# Altium footprint library MiscDevices.PcbLib: 251 footprints (part 5 of 16)
Each footprint in its own frame and in the unit in brackets; x right, y up, seen from the top. Pads: shape width x height; smd on the part's side, far side on the other; paste and mask are expansions set on the pad; w line width, h text height; cw(c..) or ccw(c..) is an arc to the next point about the centre after c.
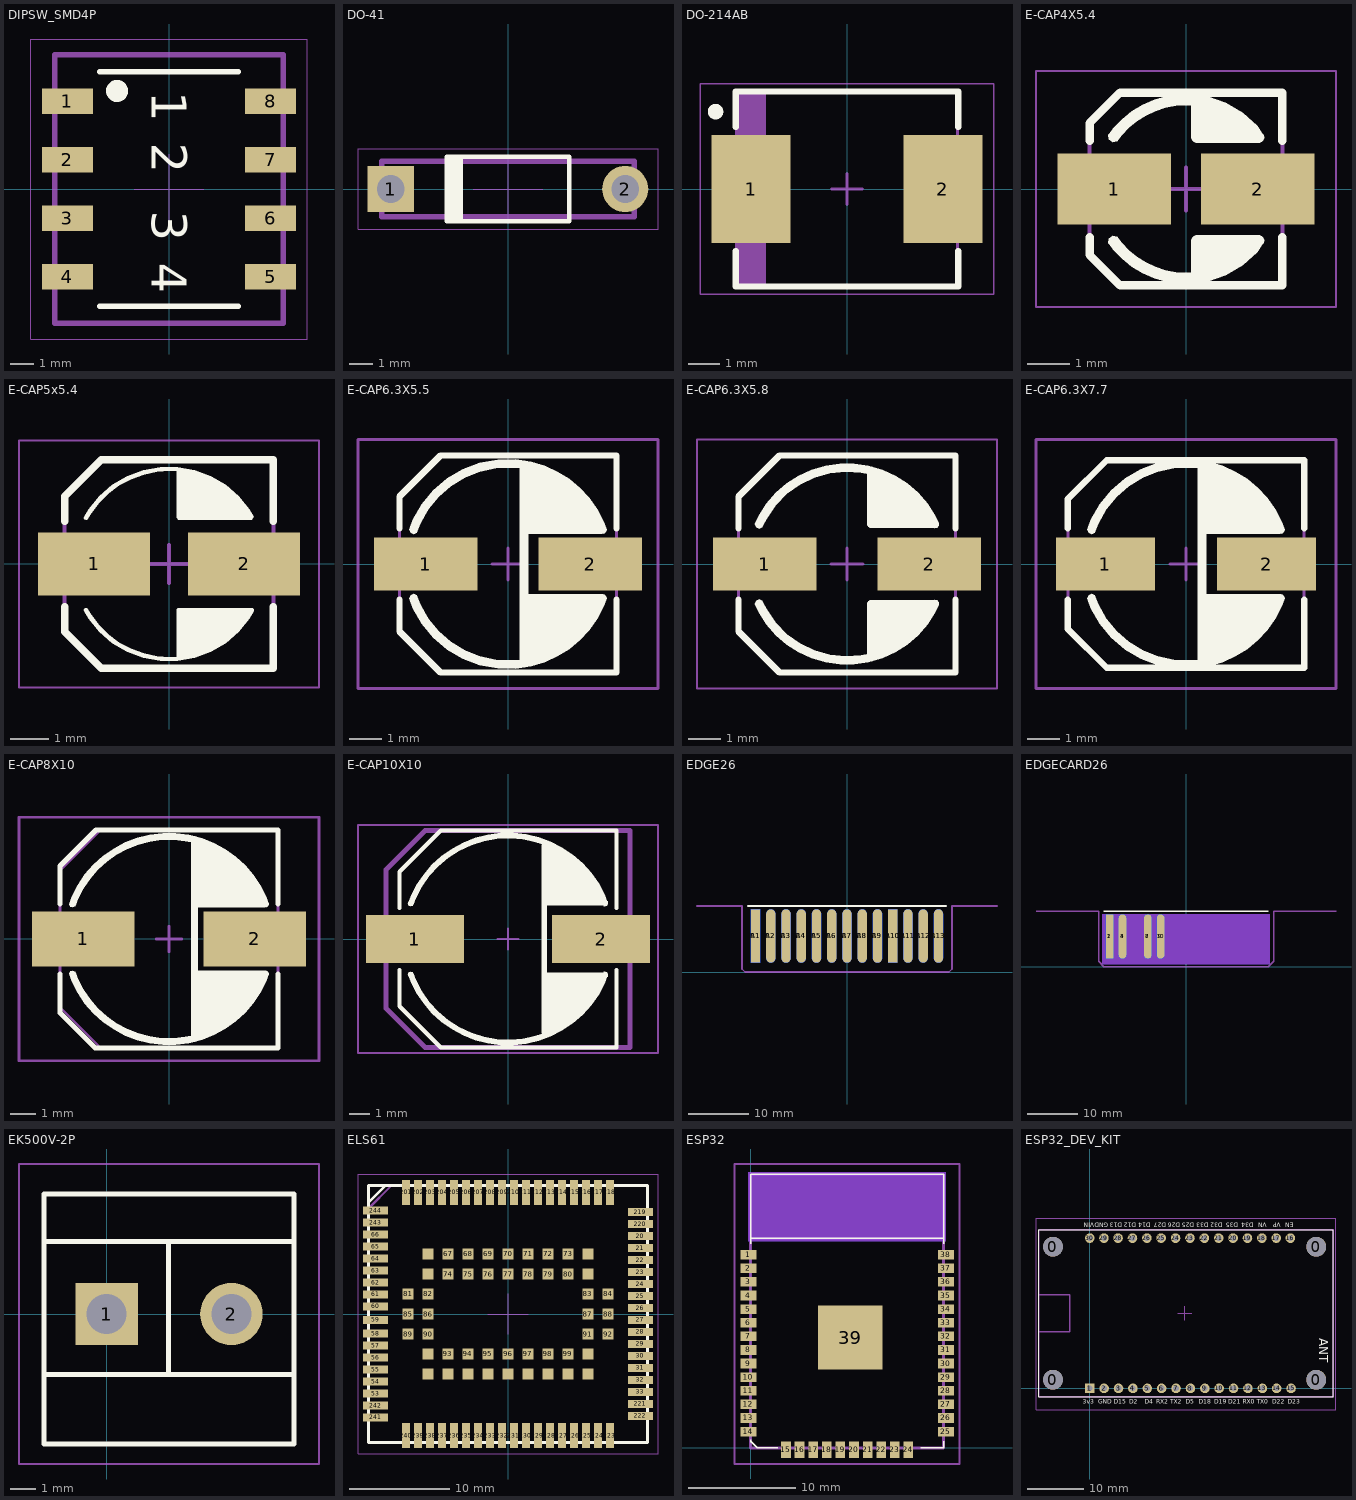
[diagram p4: the footprints below, top view; thin cyan lines are the x and y axes]

## DIPSW_SMD4P [mm]
pads (8):
  rect 2.2x1.1 smd: 1(-4.4,3.81) 2(-4.4,1.27) 3(-4.4,-1.27) 4(-4.4,-3.81) 5(4.4,-3.81) 6(4.4,-1.27) 7(4.4,1.27) 8(4.4,3.81)
Top Overlay:
  circle w0.75: c-2.25,4.25 r0.1
  lines w0.254: -3,-5.08 3,-5.08 ; -3,5.08 3,5.08
  text "4" at -0.748,-3.194 h1.52
  text "3" at -0.748,-0.944 h1.52
  text "2" at -0.746,1.996 h1.52
  text "1" at -0.746,4.246 h1.52
Top Designator (Mech7):
  text ".Designator" at -7.618,-0.508 h1.52
Top Assembly:
  lines w0.254: -4.95,-5.815 -4.95,5.815 4.95,5.815 4.95,-5.815 -4.95,-5.815
Top Courtyard:
  lines w0.05: -1.5,0 1.5,0 ; 0,-1.5 0,1.5 ; -6,-6.5 -6,6.5 6,6.5 6,-6.5 -6,-6.5
3D body "User Library-DIP SW 4P.STEP": height 4.16, standoff 0.01, extent -4.95,-5.815 4.95,5.815

## DO-41 [mm] "Diode, Axial; Body 5.2 x 2.7 mm (LxDia. max), Lead Dia. 0.86 mm (max)"
height 2.8
pads (2):
  rect 2x2 hole 1.2: 1(-5.08,0)
  round 2 hole 1.2: 2(5.08,0)
Top Overlay:
  region: -1.95,1.4 -2.75,1.4 -2.75,-1.4 -1.95,-1.4
  lines w0.2: -2.65,-1.4 2.65,-1.4 2.65,1.4 -2.65,1.4
Top Designator (Mech7):
  text ".Designator" at -7.618,-0.508 h1.52
Top Assembly:
  lines w0.254: -5.47,-1.201 -5.47,1.201 5.47,1.201 5.47,-1.201 -5.47,-1.201
Top Courtyard:
  lines w0.05: -1.5,0 1.5,0 ; 0,-1.5 0,1.5 ; -6.5,-1.75 -6.5,1.75 6.5,1.75 6.5,-1.75 -6.5,-1.75
3D body "User Library-DO-41G-40.STEP": height 2.52, standoff -2, extent -5.47,-1.201 5.47,1.201

## DO-214AB [mm] "Molded Diode, 2-Leads, Body 6.88x5.90mm, IPC Medium Density"
height 2.61
pads (2):
  rect 2.55x3.5 smd: 1(-3.1,0) 2(3.1,0)
Top Overlay:
  circle w0.25: c-4.25,2.5 r0.125
  lines w0.2: -3.6,-2 -3.6,-3.15 3.6,-3.15 3.6,-2 ; -3.6,2 -3.6,3.15 3.6,3.15 3.6,2
Top Designator (Mech7):
  text ".Designator" at -7.618,-0.508 h1.52
Top Assembly:
  rectangle: -3.575,-3.125 -2.613,3.125
  lines w0.1: -3.575,-3.125 -3.575,3.125 3.575,3.125 3.575,-3.125 -3.575,-3.125
Top Courtyard:
  lines w0.05: -4.75,-3.4 -4.75,3.4 4.75,3.4 4.75,-3.4 -4.75,-3.4
  lines w0.1: -0.5,0 0.5,0 ; 0,-0.5 0,0.5
3D body "User Library-DO-214AB SMC.STEP": height 2.32, standoff 0.01, extent -3.975,-2.95 3.975,2.95

## E-CAP4X5.4 [mm]
height 5.9
pads (2):
  rect 2.65x1.65 smd: 1(-1.675,0) 2(1.675,0)
Top Overlay:
  region: -1.782,1.304 -1.813,1.261 -1.797,1.157 -1.712,1.095 -1.607,1.111 -1.576,1.153 -1.501,1.25 -1.333,1.427 -1.144,1.583 -0.938,1.713 -0.716,1.817 -0.484,1.892 -0.244,1.938 0,1.953 0.123,1.949 0.123,1.209 0.123,1.184 0.142,1.137 0.178,1.101 0.225,1.082 0.25,1.082 1.693,1.082 1.718,1.082 1.765,1.101 1.801,1.137 1.82,1.184 1.82,1.209 1.82,1.219 1.817,1.239 1.811,1.258 1.802,1.275 1.797,1.283 1.663,1.47 1.324,1.781 0.929,2.016 0.494,2.164 0.265,2.192 0.12,2.209 -0.173,2.206 -0.463,2.164 -0.744,2.084 -1.013,1.967 -1.264,1.816 -1.493,1.633 -1.695,1.422
  region: -1.782,-1.304 -1.813,-1.261 -1.797,-1.157 -1.712,-1.095 -1.607,-1.111 -1.576,-1.153 -1.501,-1.25 -1.333,-1.427 -1.144,-1.583 -0.938,-1.713 -0.716,-1.817 -0.484,-1.892 -0.244,-1.938 0,-1.953 0.123,-1.949 0.123,-1.209 0.123,-1.184 0.142,-1.137 0.178,-1.101 0.225,-1.082 0.25,-1.082 1.693,-1.082 1.718,-1.082 1.765,-1.101 1.801,-1.137 1.82,-1.184 1.82,-1.209 1.82,-1.219 1.817,-1.239 1.811,-1.258 1.802,-1.275 1.797,-1.283 1.663,-1.47 1.324,-1.781 0.929,-2.016 0.494,-2.164 0.265,-2.192 0.12,-2.209 -0.173,-2.206 -0.463,-2.164 -0.744,-2.084 -1.013,-1.967 -1.264,-1.816 -1.493,-1.633 -1.695,-1.422
  lines w0.2: -2.25,-1.125 -2.25,-1.538 -1.538,-2.25 2.25,-2.25 2.25,-1.125 ; -2.25,1.125 -2.25,1.538 -1.538,2.25 2.25,2.25 2.25,1.125
Top Designator (Mech7):
  text "'.Designator'" at 0.508,-6.907 h1.22
Top Assembly:
  lines w0.1: -2.25,-1.538 -2.25,1.538 -1.538,2.25 2.25,2.25 2.25,-2.25 -1.538,-2.25 -2.25,-1.538
Top Courtyard:
  lines w0.05: -3.5,-2.75 3.5,-2.75 3.5,2.75 -3.5,2.75 -3.5,-2.75
  lines w0.1: -0.5,0 0.5,0 ; 0,-0.5 0,0.5
3D body "E-CAP4X5.4.step": height 5.9, standoff 0, extent -2.3,-2.25 2.3,2.25

## E-CAP5x5.4 [mm] "Aluminum Electrolytic Capacitor, Body 5.30x5.30x5.40mm, IPC Medium Density"
height 5.4
pads (2):
  rect 2.95x1.65 smd: 1(-1.975,0) 2(1.975,0)
Top Overlay:
  region: -2.229,1.239 -2.119,1.437 -1.833,1.788 -1.489,2.083 -1.098,2.313 -0.673,2.47 -0.227,2.55 0.227,2.55 0.673,2.47 1.098,2.313 1.489,2.083 1.833,1.788 2.119,1.437 2.229,1.239 2.185,1.164 0.25,1.164 0.2,1.214 0.2,2.441 0.024,2.449 -0.325,2.428 -0.668,2.357 -0.998,2.237 -1.307,2.072 -1.589,1.864 -1.839,1.619 -2.051,1.34 -2.141,1.19 -2.151,1.171 -2.192,1.16 -2.228,1.18 -2.24,1.22
  region: -2.229,-1.239 -2.119,-1.437 -1.833,-1.788 -1.489,-2.083 -1.098,-2.313 -0.673,-2.47 -0.227,-2.55 0.227,-2.55 0.673,-2.47 1.098,-2.313 1.489,-2.083 1.833,-1.788 2.119,-1.437 2.229,-1.239 2.185,-1.164 0.25,-1.164 0.2,-1.214 0.2,-2.441 0.024,-2.449 -0.325,-2.428 -0.668,-2.357 -0.998,-2.237 -1.307,-2.072 -1.589,-1.864 -1.839,-1.619 -2.051,-1.34 -2.141,-1.19 -2.151,-1.171 -2.192,-1.16 -2.228,-1.18 -2.24,-1.22
  lines w0.1: -2.185,-1.214 ccw(c0,0) 2.185,-1.214 0.25,-1.214 0.25,-2.487
  lines w0.2: -2.75,-1.125 -2.75,-1.787 -1.787,-2.75 2.75,-2.75 2.75,-1.125 ; -2.75,1.125 -2.75,1.787 -1.787,2.75 2.75,2.75 2.75,1.125
Top Designator (Mech7):
  text ".Designator" at 0.508,-7.618 h1.52
Top Assembly:
  lines w0.1: -2.75,-1.787 -1.787,-2.75 2.75,-2.75 2.75,2.75 -1.787,2.75 -2.75,1.787 -2.75,-1.787
Top Courtyard:
  lines w0.05: -3.95,-3.25 -3.95,3.25 3.95,3.25 3.95,-3.25 -3.95,-3.25
  lines w0.1: -0.5,0 0.5,0 ; 0,-0.5 0,0.5
3D body "E-CAP5x5.4.step": height 5.4, standoff 0, extent -2.75,-2.75 2.75,2.75

## E-CAP6.3X5.5 [mm] "Aluminum Electrolytic Capacitor, Body 6.60x6.60x5.50mm, IPC Medium Density"
height 5.5
pads (2):
  rect 3.25x1.65 smd: 1(-2.575,0) 2(2.575,0)
Top Overlay:
  region: -2.84,-1.034 -2.743,-1.269 -2.492,-1.71 -2.171,-2.103 -1.788,-2.437 -1.355,-2.702 -0.884,-2.89 -0.388,-2.998 0.119,-3.02 0.373,-3 0.373,3 0.119,3.02 -0.388,2.998 -0.884,2.89 -1.355,2.702 -1.788,2.437 -2.171,2.103 -2.492,1.71 -2.743,1.269 -2.84,1.034 -2.858,0.984 -2.954,0.94 -3.053,0.976 -3.098,1.071 -3.08,1.121 -2.983,1.387 -2.7,1.879 -2.337,2.315 -1.905,2.682 -1.416,2.969 -0.884,3.169 -0.327,3.273 0.24,3.281 0.52,3.236 0.735,3.201 1.153,3.076 1.55,2.896 1.92,2.665 2.256,2.388 2.552,2.068 2.803,1.712 3.005,1.326 3.08,1.121 3.082,1.116 3.085,1.105 3.086,1.094 3.087,1.083 3.087,1.077 3.087,1.052 3.068,1.005 3.032,0.969 2.985,0.95 2.96,0.95 0.627,0.95 0.627,-0.95 2.96,-0.95 2.985,-0.95 3.032,-0.969 3.068,-1.005 3.087,-1.052 3.087,-1.077 3.087,-1.083 3.086,-1.094 3.085,-1.105 3.082,-1.116 3.08,-1.121 3.005,-1.326 2.803,-1.712 2.552,-2.068 2.256,-2.388 1.92,-2.665 1.55,-2.896 1.153,-3.076 0.735,-3.201 0.52,-3.236 0.24,-3.281 -0.327,-3.273 -0.884,-3.169 -1.416,-2.969 -1.905,-2.682 -2.337,-2.315 -2.7,-1.879 -2.983,-1.387 -3.08,-1.121 -3.098,-1.071 -3.053,-0.976 -2.954,-0.94 -2.858,-0.984
  lines w0.2: -3.4,-1.125 -3.4,-2.113 -2.113,-3.4 3.4,-3.4 3.4,-1.125 ; -3.4,1.125 -3.4,2.113 -2.113,3.4 3.4,3.4 3.4,1.125
  lines w0.254: -2.96,-1.077 ccw(c0,0) 2.96,-1.077 0.5,-1.077 ; -2.96,1.077 cw(c0,0) 2.96,1.077 0.5,1.077 ; 0.5,-3.11 0.5,3.11
Top Designator (Mech7):
  text ".Designator" at 0.508,-7.618 h1.52
Top Assembly:
  lines w0.1: -3.4,-2.113 -3.4,2.113 -2.113,3.4 3.4,3.4 3.4,-3.4 -2.113,-3.4 -3.4,-2.113
Top Courtyard:
  lines w0.1: -0.5,0 0.5,0 ; 0,-0.5 0,0.5 ; -4.7,-3.9 4.7,-3.9 4.7,3.9 -4.7,3.9 -4.7,-3.9
3D body "User Library-CAP SMD SVP 6_3x5_9.STEP": height 5.9, standoff 0, extent -3.65,-3.3 3.65,3.3

## E-CAP6.3X5.8 [mm] "Aluminum Electrolytic Capacitor, Body 6.60x6.60x6.30mm, IPC Medium Density"
height 6.3
pads (2):
  rect 3.25x1.65 smd: 1(-2.575,0) 2(2.575,0)
Top Overlay:
  region: -2.866,-1.303 -2.888,-1.255 -2.851,-1.156 -2.755,-1.112 -2.656,-1.149 -2.634,-1.197 -2.52,-1.421 -2.237,-1.835 -1.887,-2.194 -1.48,-2.486 -1.028,-2.705 -0.545,-2.842 -0.047,-2.893 0.454,-2.858 0.7,-2.808 0.7,-1.25 0.7,-1.24 0.707,-1.221 0.721,-1.207 0.74,-1.2 0.75,-1.2 2.633,-1.2 2.633,-1.199 2.634,-1.198 2.634,-1.197 2.653,-1.156 2.733,-1.116 2.821,-1.135 2.877,-1.205 2.877,-1.25 2.877,-1.257 2.876,-1.27 2.873,-1.284 2.869,-1.297 2.866,-1.303 2.773,-1.508 2.529,-1.888 2.234,-2.229 1.894,-2.525 1.515,-2.769 1.105,-2.957 0.672,-3.084 0.226,-3.148 -0.226,-3.148 -0.672,-3.084 -1.105,-2.957 -1.515,-2.769 -1.894,-2.525 -2.234,-2.229 -2.529,-1.888 -2.773,-1.508
  region: -2.866,1.303 -2.888,1.255 -2.851,1.156 -2.755,1.112 -2.656,1.149 -2.634,1.197 -2.52,1.421 -2.237,1.835 -1.887,2.194 -1.48,2.486 -1.028,2.705 -0.545,2.842 -0.047,2.893 0.454,2.858 0.7,2.808 0.7,1.25 0.7,1.24 0.707,1.221 0.721,1.207 0.74,1.2 0.75,1.2 2.633,1.2 2.633,1.199 2.634,1.198 2.634,1.197 2.653,1.156 2.733,1.116 2.821,1.135 2.877,1.205 2.877,1.25 2.877,1.257 2.876,1.27 2.873,1.284 2.869,1.297 2.866,1.303 2.773,1.508 2.529,1.888 2.234,2.229 1.894,2.525 1.515,2.769 1.105,2.957 0.672,3.084 0.226,3.148 -0.226,3.148 -0.672,3.084 -1.105,2.957 -1.515,2.769 -1.894,2.525 -2.234,2.229 -2.529,1.888 -2.773,1.508
  lines w0.2: -3.4,-1.125 -3.4,-2.113 -2.113,-3.4 3.4,-3.4 3.4,-1.125 ; -3.4,1.125 -3.4,2.113 -2.113,3.4 3.4,3.4 3.4,1.125
  lines w0.254: 0.75,-2.926 0.75,-1.25 2.75,-1.25 ; 0.75,2.926 0.75,1.25 2.75,1.25
Top Designator (Mech7):
  text ".Designator" at 0.508,-7.618 h1.52
Top Assembly:
  lines w0.1: -3.4,-2.113 -2.113,-3.4 3.4,-3.4 3.4,3.4 -2.113,3.4 -3.4,2.113 -3.4,-2.113
Top Courtyard:
  lines w0.05: -4.7,-3.9 -4.7,3.9 4.7,3.9 4.7,-3.9 -4.7,-3.9
  lines w0.1: -0.5,0 0.5,0 ; 0,-0.5 0,0.5
3D body "E-CAP6.3X5.8.step": height 6.3, standoff 0, extent -3.5,-3.4 3.5,3.4

## E-CAP6.3X7.7 [mm] "Aluminum Electrolytic Capacitor, Body 6.60x6.60x7.70mm, IPC Medium Density"
height 8.2
pads (2):
  rect 3.1x1.65 smd: 1(-2.525,0) 2(2.525,0)
Top Overlay:
  region: -2.84,-1.034 -2.743,-1.269 -2.492,-1.71 -2.171,-2.103 -1.788,-2.437 -1.355,-2.702 -0.884,-2.89 -0.388,-2.998 0.119,-3.02 0.373,-3 0.373,3 0.119,3.02 -0.388,2.998 -0.884,2.89 -1.355,2.702 -1.788,2.437 -2.171,2.103 -2.492,1.71 -2.743,1.269 -2.84,1.034 -2.858,0.984 -2.954,0.94 -3.053,0.976 -3.098,1.071 -3.08,1.121 -2.983,1.387 -2.7,1.879 -2.337,2.315 -1.905,2.682 -1.416,2.969 -0.884,3.169 -0.327,3.273 0.24,3.281 0.52,3.236 0.735,3.201 1.153,3.076 1.55,2.896 1.92,2.665 2.256,2.388 2.552,2.068 2.803,1.712 3.005,1.326 3.08,1.121 3.082,1.116 3.085,1.105 3.086,1.094 3.087,1.083 3.087,1.077 3.087,1.052 3.068,1.005 3.032,0.969 2.985,0.95 2.96,0.95 0.627,0.95 0.627,-0.95 2.96,-0.95 2.985,-0.95 3.032,-0.969 3.068,-1.005 3.087,-1.052 3.087,-1.077 3.087,-1.083 3.086,-1.094 3.085,-1.105 3.082,-1.116 3.08,-1.121 3.005,-1.326 2.803,-1.712 2.552,-2.068 2.256,-2.388 1.92,-2.665 1.55,-2.896 1.153,-3.076 0.735,-3.201 0.52,-3.236 0.24,-3.281 -0.327,-3.273 -0.884,-3.169 -1.416,-2.969 -1.905,-2.682 -2.337,-2.315 -2.7,-1.879 -2.983,-1.387 -3.08,-1.121 -3.098,-1.071 -3.053,-0.976 -2.954,-0.94 -2.858,-0.984
  lines w0.2: -3.7,-1.125 -3.7,-2.038 -2.487,-3.25 3.7,-3.25 3.7,-1.125 ; -3.7,1.125 -3.7,2.037 -2.487,3.25 3.7,3.25 3.7,1.125
Top Designator (Mech7):
  text ".Designator" at 0.508,-7.618 h1.52
Top Assembly:
  lines w0.1: -3.7,-2.038 -2.487,-3.25 3.7,-3.25 3.7,3.25 -2.487,3.25 -3.7,2.037 -3.7,-2.038
Top Courtyard:
  lines w0.1: -0.5,0 0.5,0 ; 0,-0.5 0,0.5 ; -4.7,-3.9 -4.7,3.9 4.7,3.9 4.7,-3.9 -4.7,-3.9
3D body "E-CAP6.3X7.7.step": height 8.2, standoff 0, extent -3.7,-3.25 3.7,3.25

## E-CAP8X10 [mm] "Aluminum Electrolytic Capacitor, Body 8.30x8.30x10.80mm, IPC Medium Density"
height 10.8
pads (2):
  rect 4x2.15 smd: 1(-3.35,0) 2(3.35,0)
Top Overlay:
  region: -3.639,-1.325 -3.553,-1.542 -3.341,-1.958 -3.081,-2.347 -2.776,-2.701 -2.43,-3.015 -2.049,-3.286 -1.638,-3.509 -1.204,-3.681 -0.752,-3.799 -0.289,-3.862 0.179,-3.868 0.643,-3.819 0.873,-3.773 0.873,3.773 0.643,3.819 0.179,3.868 -0.289,3.862 -0.752,3.799 -1.204,3.681 -1.638,3.509 -2.049,3.286 -2.43,3.015 -2.776,2.701 -3.081,2.347 -3.341,1.958 -3.553,1.542 -3.639,1.325 -3.657,1.275 -3.753,1.23 -3.852,1.266 -3.897,1.362 -3.878,1.412 -3.792,1.649 -3.562,2.1 -3.279,2.519 -2.947,2.901 -2.571,3.239 -2.156,3.528 -1.709,3.765 -1.237,3.946 -0.746,4.067 -0.243,4.128 0.262,4.127 0.764,4.064 1.009,4.002 1.015,4.002 1.026,4 1.037,3.997 1.048,3.993 1.053,3.991 1.294,3.927 1.756,3.743 2.194,3.505 2.599,3.216 2.966,2.88 3.291,2.503 3.568,2.089 3.793,1.646 3.878,1.412 3.88,1.406 3.883,1.396 3.885,1.385 3.886,1.374 3.886,1.368 3.886,1.343 3.867,1.296 3.831,1.26 3.784,1.241 3.759,1.241 1.127,1.241 1.127,-1.241 3.759,-1.241 3.784,-1.241 3.831,-1.26 3.867,-1.296 3.886,-1.343 3.886,-1.368 3.886,-1.374 3.885,-1.385 3.883,-1.396 3.88,-1.406 3.878,-1.412 3.793,-1.646 3.568,-2.089 3.291,-2.503 2.966,-2.88 2.599,-3.216 2.194,-3.505 1.756,-3.743 1.294,-3.927 1.053,-3.991 1.048,-3.993 1.037,-3.997 1.026,-4 1.015,-4.002 1.009,-4.002 0.764,-4.064 0.262,-4.127 -0.243,-4.128 -0.746,-4.067 -1.237,-3.946 -1.709,-3.765 -2.156,-3.528 -2.571,-3.239 -2.947,-2.901 -3.279,-2.519 -3.562,-2.1 -3.792,-1.649 -3.878,-1.412 -3.897,-1.362 -3.852,-1.266 -3.753,-1.23 -3.657,-1.275
  lines w0.2: -4.25,-1.375 -4.25,-2.878 -2.878,-4.25 4.25,-4.25 4.25,-1.375 ; -4.25,1.375 -4.25,2.848 -2.848,4.25 4.25,4.25 4.25,1.375
  lines w0.254: -3.759,-1.368 ccw(c0,0) 3.759,-1.368 1,-1.368 ; -3.759,1.368 cw(c0,0) 3.759,1.368 1.007,1.368 ; 1,-3.875 1,3.875
Top Designator (Mech7):
  text ".Designator" at 0.508,-7.618 h1.52
Top Assembly:
  lines w0.1: -4.25,-2.663 -2.663,-4.25 4.25,-4.25 4.25,4.25 -2.663,4.25 -4.25,2.662 -4.25,-2.663
Top Courtyard:
  lines w0.1: -0.5,0 0.5,0 ; 0,-0.5 0,0.5 ; -5.85,-4.75 -5.85,4.75 5.85,4.75 5.85,-4.75 -5.85,-4.75
3D body "User Library-AL_EL_cap_8mmx10mm.STEP": height 10.51, standoff 0.01, extent -4.852,-4.25 4.848,4.25

## E-CAP10X10 [mm] "Aluminum Electrolytic Capacitor, Body 10x10x10.80mm, IPC Medium Density"
height 10.8
pads (2):
  rect 4.75x2.3 smd: 1(-4.5,0) 2(4.5,0)
Top Overlay:
  drawing of 12 lines, arcs and shapes, not listed
Top Designator (Mech7):
  text ".Designator" at 0.508,-7.618 h1.52
Top Assembly:
  lines w0.254: -5.9,-3.35 -4,-5.25 5.9,-5.25 5.9,5.25 -4,5.25 -5.9,3.35 -5.9,-3.35
Top Courtyard:
  lines w0.1: -0.5,0 0.5,0 ; 0,-0.5 0,0.5 ; -7.25,-5.5 7.25,-5.5 7.25,5.5 -7.25,5.5 -7.25,-5.5
3D body "User Library-cap_10x10x10-1.STEP": height 10.52, standoff 0.02, extent -5.9,-5.25 5.9,5.25

## EDGE26 [mm]
pads (26):
  rect 1.524x8.89 smd paste-10 mask+0.102: A1(-15.24,6)
  oval 1.524x8.89 smd paste-10: A2(-12.7,6) A3(-10.16,6) A4(-7.62,6) A5(-5.08,6) A6(-2.54,6) A7(0,6) A8(2.54,6) A9(5.08,6) A11(10.16,6) A12(12.7,6) A13(15.24,6)
  rect 1.524x8.89 smd paste-10: A10(7.62,6)
  rect 1.524x8.89 smd far side paste-10: B1(-15.24,6) B10(7.62,6)
  oval 1.524x8.89 smd far side paste-10: B2(-12.7,6) B3(-10.16,6) B4(-7.62,6) B5(-5.08,6) B6(-2.54,6) B7(0,6) B8(2.54,6) B9(5.08,6) B11(10.16,6) B12(12.7,6) B13(15.24,6)
Top Overlay:
  lines w0.254: -16.5,11 16.5,11
Bottom Overlay:
  lines w0.254: -16.5,11 16.5,11
Mechanical 1:
  lines w0.254: -25,11 -17.5,11 -17.5,0.5 -17,0 17,0 17.5,0.5 17.5,11 25,11
Top Designator (Mech7):
  text ".Designator" at -7.618,5.492 h1.52

## EDGECARD26 [mm]
pads (8):
  rect 1.524x8.89 smd far side paste-10: 1(-15.24,6)
  rect 1.524x8.89 smd paste-10 mask+0.102: 2(-15.24,6)
  oval 1.524x8.89 smd far side paste-10: 3(-12.7,6) 7(-7.62,6) 9(-5.08,6)
  oval 1.524x8.89 smd paste-10: 4(-12.7,6) 8(-7.62,6) 10(-5.08,6)
Top Layer keep-out:
  region: -16.75,10.5 16.75,10.5 16.75,0.5 -16.75,0.5
Bottom Layer keep-out:
  region: -16.75,10.5 -16.75,0.5 16.75,0.5 16.75,10.5
Top Overlay:
  lines w0.254: -16.5,11 16.5,11
Mechanical 1:
  lines w0.254: -30,11 -17.5,11 -17.5,1 -16.5,0 16.5,0 17.5,1 17.5,11 30,11
Top Designator (Mech7):
  text ".Designator" at -7.618,5.492 h1.52

## EK500V-2P [mm] "Screw Terminal Block 2Pins, Pitch 5.00mm,300V/20A  PCB Type"
height 13.8
pads (2):
  rect 2.5x2.5 hole 1.6: 1(0,0)
  round 2.5 hole 1.6: 2(5,0)
Top Overlay:
  lines w0.2: -2.475,-2.416 7.375,-2.416 ; -2.475,2.892 7.375,2.892 ; 2.489,-2.416 2.489,2.842 ; -2.5,-5.2 7.5,-5.2 7.5,4.8 -2.5,4.8 -2.5,-5.2
Top Courtyard:
  lines w0.1: -3.5,-6 -3.5,6 8.5,6 8.5,-6 -3.5,-6
3D body "User Library-klema-5mm-2pin.STEP": height 14.01, standoff -3.99, extent -2.5,-5 7.5,5.5

## ELS61 [mm]
pads (120):
  rect 2.5x0.8 smd: 20(13.25,7.8) 21(13.25,6.6) 22(13.25,5.4) 23(13.25,4.2) 24(13.25,3) 25(13.25,1.8) 26(13.25,0.6) 27(13.25,-0.6) 28(13.25,-1.8) 29(13.25,-3) 30(13.25,-4.2) 31(13.25,-5.4) 32(13.25,-6.6) 33(13.25,-7.8) 53(-13.25,-7.95) 54(-13.25,-6.75) 55(-13.25,-5.55) 56(-13.25,-4.35) 57(-13.25,-3.15) 58(-13.25,-1.95) 59(-13.25,-0.6) 60(-13.25,0.75) 61(-13.25,1.95) 62(-13.25,3.15) 63(-13.25,4.35) 64(-13.25,5.55) 65(-13.25,6.75) 66(-13.25,7.95) 219(13.25,10.2) 220(13.25,9) 221(13.25,-9) 222(13.25,-10.2) 241(-13.25,-10.35) 242(-13.25,-9.15) 243(-13.25,9.15) 244(-13.25,10.35)
  rect 1.1x1.1 smd: 67(-6,6) 68(-4,6) 69(-2,6) 70(0,6) 71(2,6) 72(4,6) 73(6,6) 74(-6,4) 75(-4,4) 76(-2,4) 77(0,4) 78(2,4) 79(4,4) 80(6,4) 81(-10,2) 82(-8,2) 83(8,2) 84(10,2) 85(-10,0) 86(-8,0) 87(8,0) 88(10,0) 89(-10,-2) 90(-8,-2) 91(8,-2) 92(10,-2) 93(-6,-4) 94(-4,-4) 95(-2,-4) 96(0,-4) 97(2,-4) 98(4,-4) 99(6,-4) 100(-6,-6) 101(-4,-6) 102(-2,-6) 103(0,-6) 104(2,-6) 105(4,-6) 106(6,-6) 245(-8,6) 246(8,6) 247(8,4) 248(8,-4) 249(8,-6) 250(-8,-6) 251(-8,-4) 252(-8,4)
  rect 0.8x2.5 smd: 201(-10.2,12.15) 202(-9,12.15) 203(-7.8,12.15) 204(-6.6,12.15) 205(-5.4,12.15) 206(-4.2,12.15) 207(-3,12.15) 208(-1.8,12.15) 209(-0.6,12.15) 210(0.6,12.15) 211(1.8,12.15) 212(3,12.15) 213(4.2,12.15) 214(5.4,12.15) 215(6.6,12.15) 216(7.8,12.15) 217(9,12.15) 218(10.2,12.15) 223(10.2,-12.15) 224(9,-12.15) 225(7.8,-12.15) 226(6.6,-12.15) 227(5.4,-12.15) 228(4.2,-12.15) 229(3,-12.15) 230(1.8,-12.15) 231(0.6,-12.15) 232(-0.6,-12.15) 233(-1.8,-12.15) 234(-3,-12.15) 235(-4.2,-12.15) 236(-5.4,-12.15) 237(-6.6,-12.15) 238(-7.8,-12.15) 239(-9,-12.15) 240(-10.2,-12.15)
Top Overlay:
  lines w0.254: -13.9,11.2 -12.25,12.85 ; -13.95,-12.85 13.95,-12.85 13.95,12.85 -13.95,12.85 -13.95,-12.85
Top Designator (Mech7):
  text ".Designator" at -7.618,-0.508 h1.52
Top Assembly:
  lines w0.254: -13.962,10.538 -11.675,12.825 -11.5,12.825 ; -13.925,-12.825 13.925,-12.825 13.925,12.825 -13.925,12.825 -13.925,-12.825
Top Courtyard:
  lines w0.05: -2,0 2,0 ; 0,-2 0,2 ; -15,-14 15,-14 15,14 -15,14 -15,-14
3D body "ELS61.SLDPRT": height 2.47, standoff 0.01, extent -13.925,-12.825 13.925,12.825

## ESP32 [mm]
pads (39):
  rect 1.5x0.9 smd: 1(-0.203,18.034) 2(-0.203,16.764) 3(-0.203,15.494) 4(-0.203,14.224) 5(-0.203,12.954) 6(-0.203,11.684) 7(-0.203,10.414) 8(-0.203,9.144) 9(-0.203,7.874) 10(-0.203,6.604) 11(-0.203,5.334) 12(-0.203,4.064) 13(-0.203,2.794) 14(-0.203,1.524) 25(18.237,1.524) 26(18.237,2.794) 27(18.237,4.064) 28(18.237,5.334) 29(18.237,6.604) 30(18.237,7.874) 31(18.237,9.144) 32(18.237,10.414) 33(18.237,11.684) 34(18.237,12.954) 35(18.237,14.224) 36(18.237,15.494) 37(18.237,16.764) 38(18.237,18.034)
  rect 0.9x1.5 smd: 15(3.3,-0.169) 16(4.57,-0.169) 17(5.84,-0.169) 18(7.11,-0.169) 19(8.38,-0.169) 20(9.65,-0.169) 21(10.92,-0.169) 22(12.19,-0.169) 23(13.46,-0.169) 24(14.73,-0.169)
  rect 6x6 smd: 39(9.3,10.3)
Top Layer keep-out:
  rectangle: -0.203,19.25 18.237,25.75
Bottom Layer keep-out:
  rectangle: -0.25,19.25 18.25,25.75
Top Overlay:
  lines w0.127: 0,0.762 0,0.635 0.635,0 2.54,0 ; 0,19.05 0,25.527 18.034,25.527 18.034,19.05 ; 0,19.558 18.034,19.558 ; 15.875,0 18.034,0 18.034,0.635
Top Designator (Mech7):
  text ".Designator" at 1.382,14.992 h1.52
Top Assembly:
  lines w0.254: 0,19.5 18,19.5 ; 0,25.5 0,0 18,0 ; 0,25.5 0,25.5 ; 0,25.5 18,25.5 18,0 ; 18,0 18,0
Top Courtyard:
  lines w0.2: -1.5,-1.5 19.5,-1.5 19.5,26.5 -1.5,26.5 -1.5,-1.5
3D body "User Library-ESP321.STEP": height 2.91, standoff -0.01, extent 0,0 18,25.5

## ESP32_DEV_KIT [mm]
pads (34):
  round 3.5 hole 3.5: 0(-6.5,1.512) 0(-6.5,25.012) 0(40,1.512) 0(40,25.012)
  rect 1.7x1.7 hole 1: 1(0,0)
  round 1.7 hole 1: 2(2.54,0) 3(5.08,0) 4(7.62,0) 5(10.16,0) 6(12.7,0) 7(15.24,0) 8(17.78,0) 9(20.32,0) 10(22.86,0) 11(25.4,0) 12(27.94,0) 13(30.48,0) 14(33.02,0) 15(35.56,0) 16(35.44,26.525) 17(32.94,26.525) 18(30.4,26.525) 19(27.86,26.525) 20(25.32,26.525) 21(22.78,26.525) 22(20.24,26.525) 23(17.7,26.525) 24(15.16,26.525) 25(12.62,26.525) 26(10.08,26.525) 27(7.54,26.525) 28(5,26.525) 29(2.5,26.525) 30(0,26.525)
Top Overlay:
  lines w0.15: -9,-1.5 -9,28 43,28 43,-1.5 -9,-1.5
  text "EN" at 36,29.25 h0.75
  text "VP" at 33.75,29.25 h0.75
  text "VN" at 31.25,29.25 h0.75
  text "D34" at 29,29.25 h0.75
  text "D35" at 26.25,29.25 h0.75
  text "D32" at 23.5,29.25 h0.75
  text "D33" at 21,29.25 h0.75
  text "D25" at 18.5,29.25 h0.75
  text "D26" at 16,29.25 h0.75
  text "D27" at 13.5,29.25 h0.75
  text "D14" at 10.75,29.25 h0.75
  text "D12" at 8.25,29.25 h0.75
  text "D13" at 5.75,29.25 h0.75
  text "GND" at 3.25,29.25 h0.75
  text "VIN" at 0.75,29.25 h0.75
  text "D23" at 35,-2.75 h0.75
  text "D22" at 32.25,-2.75 h0.75
  text "TX0" at 29.5,-2.75 h0.75
  text "RX0" at 27,-2.75 h0.75
  text "D21" at 24.5,-2.75 h0.75
  text "D19" at 22,-2.75 h0.75
  text "D18" at 19.25,-2.75 h0.75
  text "D5" at 17,-2.75 h0.75
  text "TX2" at 14.25,-2.75 h0.75
  text "RX2" at 11.75,-2.75 h0.75
  text "D4" at 9.75,-2.75 h0.75
  text "D2" at 7,-2.75 h0.75
  text "D15" at 4.25,-2.75 h0.75
  text "GND" at 1.5,-2.75 h0.75
  text "3v3" at -1.25,-2.75 h0.75
  text "ANT" at 40.525,8.8 h1.52
Top Designator (Mech7):
  text ".Designator" at 9.382,12.617 h1.52
Top Assembly:
  lines w0.254: -9,10 -3.5,10 -3.5,16.5 -9,16.5 ; -9,-1.5 -9,28 43,28 43,-1.5 -9,-1.5
Top Courtyard:
  lines w0.2: 15.5,13.262 18,13.262 ; 16.75,12.012 16.75,14.512 ; -9.5,-3.75 43.5,-3.75 43.5,30 -9.5,30 -9.5,-3.75
3D body "female_header_a-bl254-eg-g15d.stp": height 8.51, standoff -3.19, extent -1.4,25.275 36.95,27.775
3D body "female_header_a-bl254-eg-g15d.stp": height 8.51, standoff -3.19, extent -1.4,-1.25 36.95,1.25